# Altium footprint library PCB贴片元件封装库.pcblib: 366 footprints (part 5 of 23)
Each footprint in its own frame and in the unit in brackets; x right, y up, seen from the top. Pads: shape width x height; smd on the part's side, far side on the other; paste and mask are expansions set on the pad; w line width, h text height; cw(c..) or ccw(c..) is an arc to the next point about the centre after c.
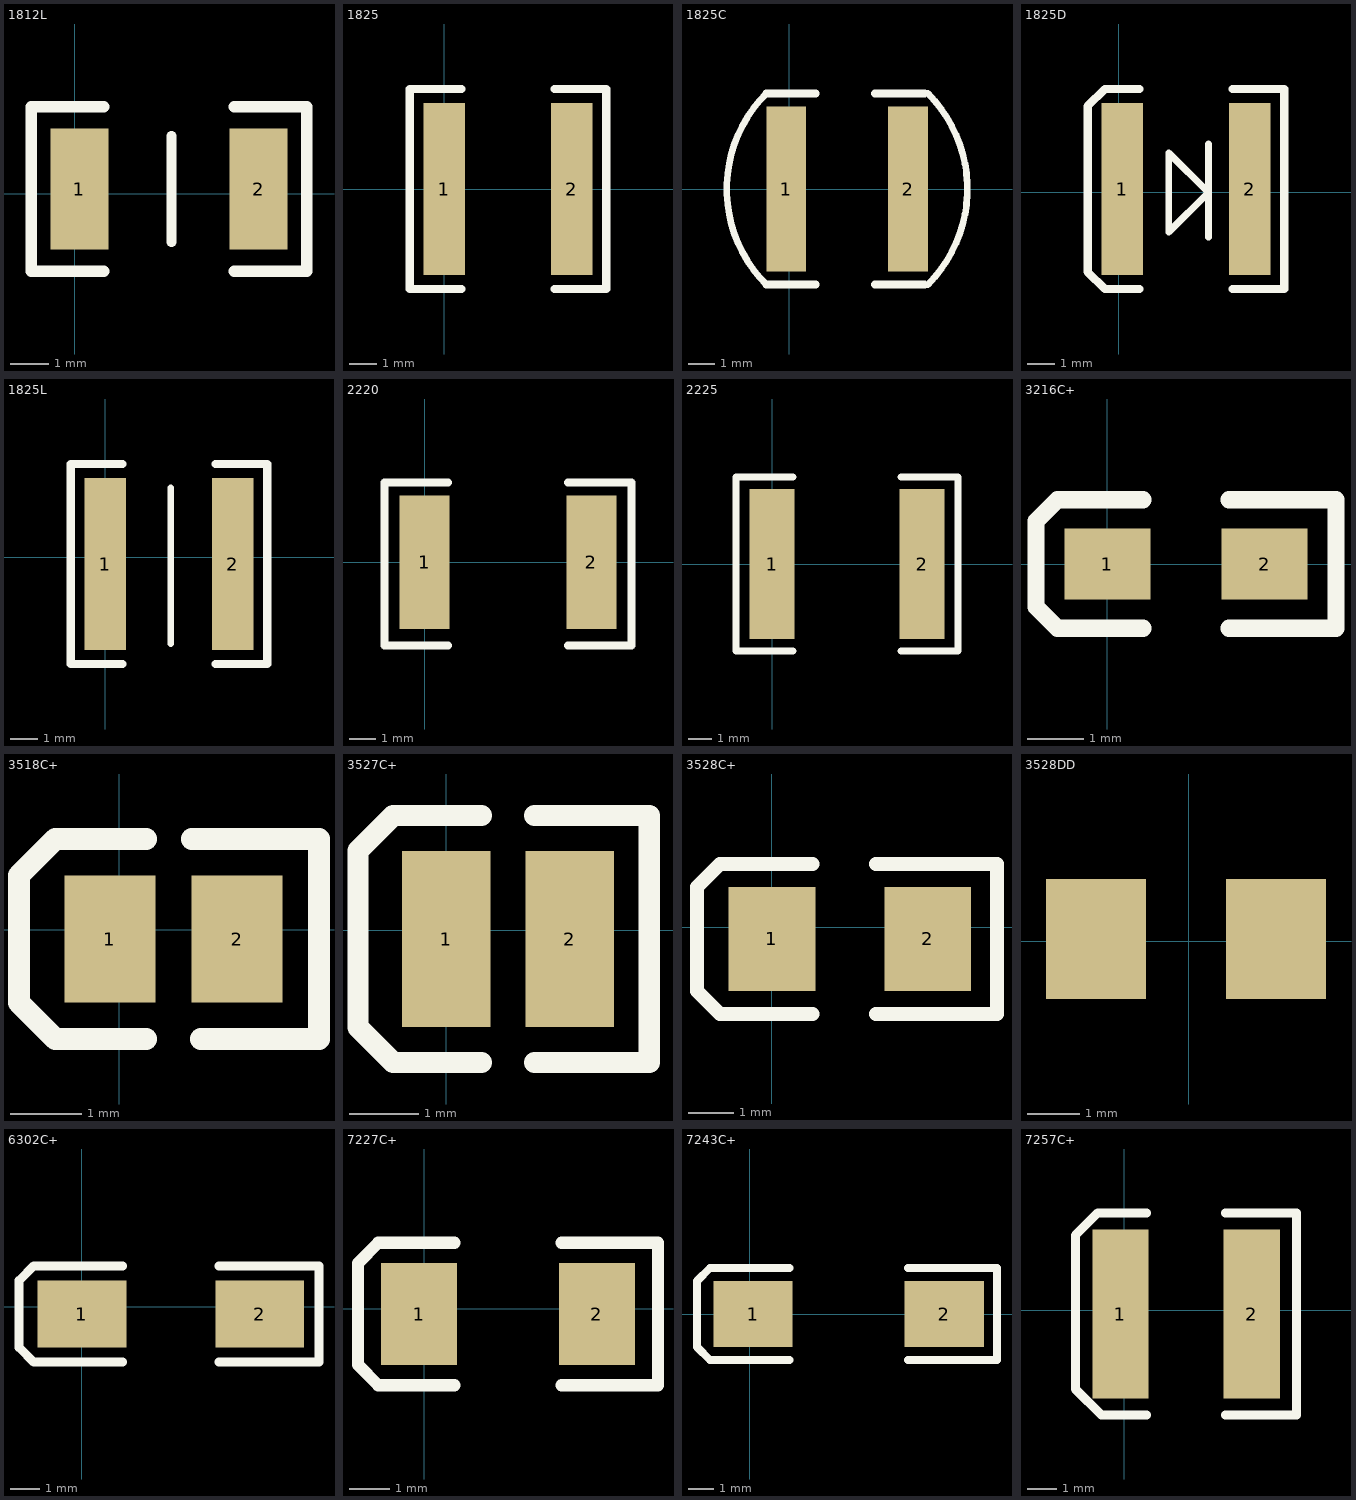
[diagram p4: the footprints below, top view; thin cyan lines are the x and y axes]

## 1812L [mil]
pads (2):
  rect 60x125 smd: 1(5,5) 2(190,5)
TopOverlay:
  lines w10: 100,-50 100,60
  lines w12: 30,-80 -45,-80 -45,90 30,90 ; 165,-80 240,-80 240,90 165,90

## 1825 [mil]
pads (2):
  rect 60x250 smd: 1(0,0) 2(185,0)
TopOverlay:
  lines w12: 25,-145 -50,-145 -50,145 25,145 ; 160,-145 235,-145 235,145 160,145

## 1825C [mil]
pads (2):
  rect 60x250 smd: 1(-5,0) 2(180,0)
TopOverlay:
  lines w10: -34.96,-144.96 cw(c110,0) -34.96,144.96 ; 210,-145 ccw(c65,0) 210,145
  lines w12: -35,-145 40,-145 ; -35,145 40,145 ; 130,-145 205,-145 ; 130,145 205,145

## 1825D [mil]
pads (2):
  rect 60x250 smd: 1(5,5) 2(190,5)
TopOverlay:
  lines w10: 130,-65 130,70 ; 72.5,-57.5 72.5,57.5 130,0 72.5,-57.5
  lines w12: 30,-140 -20,-140 -45,-115 -45,125 -20,150 30,150 ; 165,-140 240,-140 240,150 165,150

## 1825L [mil]
pads (2):
  rect 60x250 smd: 1(0,-10) 2(185,-10)
TopOverlay:
  lines w10: 95,-125 95,100
  lines w12: 25,-155 -50,-155 -50,135 25,135 ; 160,-155 235,-155 235,135 160,135

## 2220 [mil]
pads (2):
  rect 75x200 smd: 1(0,0) 2(250,0)
TopOverlay:
  lines w12: 35,-125 -60,-125 -60,120 35,120 ; 215,-125 310,-125 310,120 215,120

## 2225 [mil]
pads (2):
  rect 75x250 smd: 1(0,0) 2(250,0)
TopOverlay:
  lines w12: 35,-145 -60,-145 -60,145 35,145 ; 215,-145 310,-145 310,145 215,145

## 3216C+ [mil]
pads (2):
  rect 60x50 smd: 1(0,0) 2(110,0)
TopOverlay:
  lines w12: 25,-45 -35,-45 -50,-30 -50,30 -35,45 25,45 ; 85,-45 160,-45 160,45 85,45

## 3518C+ [mil]
pads (2):
  rect 50x70 smd: 1(-5,-5) 2(65,-5)
TopOverlay:
  lines w12: 15,-60 -35,-60 -55,-40 -55,30 -35,50 15,50 ; 40,50 110,50 110,-60 45,-60

## 3527C+ [mil]
pads (2):
  rect 50x100 smd: 1(0,-5) 2(70,-5)
TopOverlay:
  lines w12: 20,-75 -30,-75 -50,-55 -50,45 -30,65 20,65 ; 50,-75 115,-75 115,65 50,65

## 3528C+ [mil]
pads (2):
  rect 75x90 smd: 1(0,-10) 2(135,-10)
TopOverlay:
  lines w12: 35,-75 -45,-75 -65,-55 -65,35 -45,55 35,55 ; 90,-75 195,-75 195,55 90,55

## 3528DD [mil]
pads (2):
  rect 75x90 all layers, no hole: ""(-69.39,1.83) ""(65.61,1.83)

## 6302C+ [mil]
pads (2):
  rect 120x90 smd: 1(0,-10) 2(240,-10)
TopOverlay:
  lines w12: 55,-75 -65,-75 -85,-55 -85,35 -65,55 55,55 ; 185,-75 320,-75 320,55 185,55

## 7227C+ [mil]
pads (2):
  rect 75x100 smd: 1(-5,-5) 2(170,-5)
TopOverlay:
  lines w12: 30,-75 -45,-75 -65,-55 -65,45 -45,65 30,65 ; 135,-75 230,-75 230,65 135,65

## 7243C+ [mil]
pads (2):
  rect 120x100 smd: 1(5,0) 2(295,0)
TopOverlay:
  lines w12: 60,-70 -60,-70 -80,-50 -80,50 -60,70 60,70 ; 240,-70 375,-70 375,70 240,70

## 7257C+ [mil]
pads (2):
  rect 75x225 smd: 1(-5,-5) 2(170,-5)
TopOverlay:
  lines w12: 30,-140 -30,-140 -65,-105 -65,100 -35,130 30,130 ; 135,-140 230,-140 230,130 135,130